# Altium footprint library Radio Lib.PcbLib: 41 footprints (part 3 of 3)
Each footprint in its own frame and in the unit in brackets; x right, y up, seen from the top. Pads: shape width x height; smd on the part's side, far side on the other; paste and mask are expansions set on the pad; w line width, h text height; cw(c..) or ccw(c..) is an arc to the next point about the centre after c.
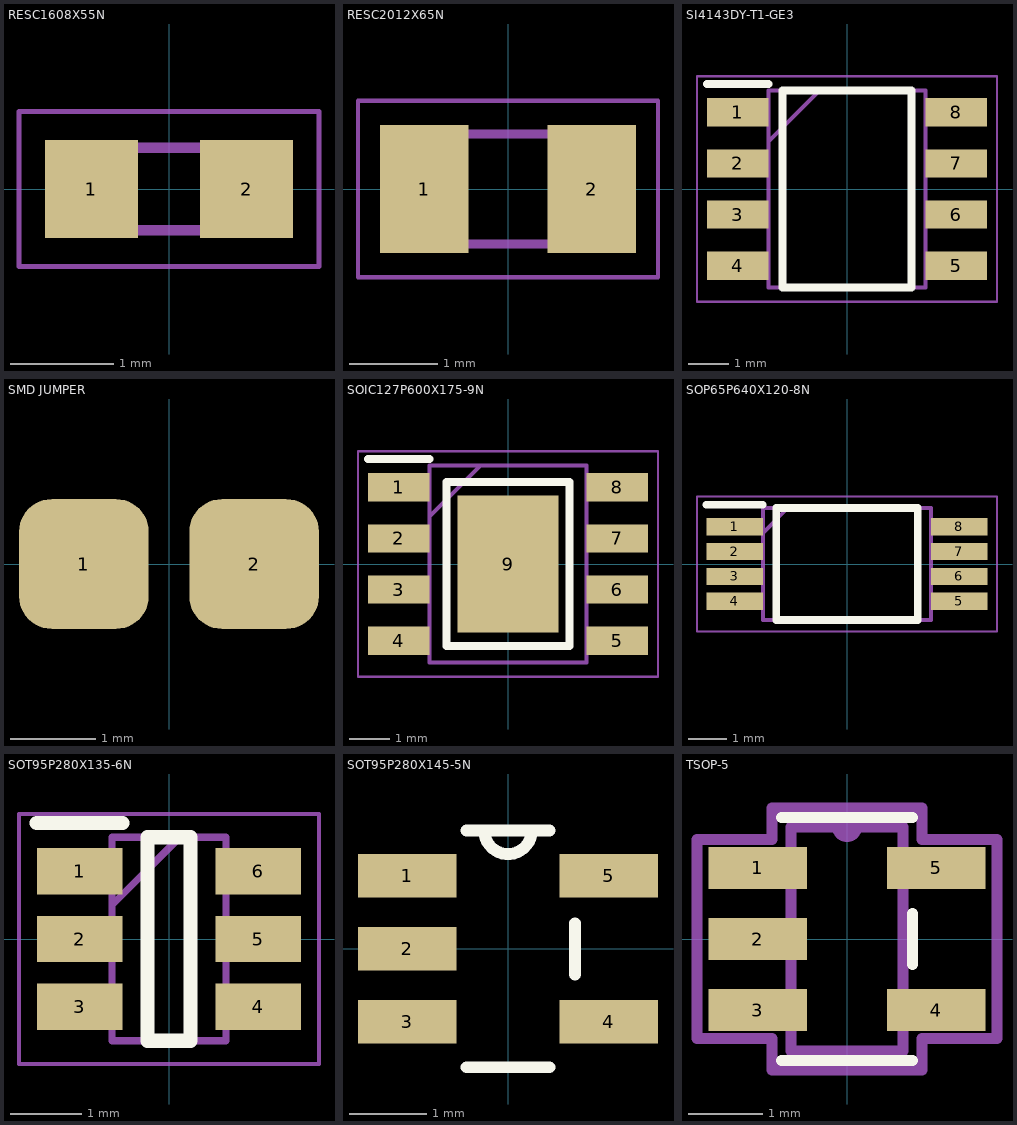
[diagram p2: the footprints below, top view; thin cyan lines are the x and y axes]

## RESC1608X55N [mm]
pads (2):
  rect 0.9x0.95 smd: 1(-0.75,0) 2(0.75,0)
Mechanical 13:
  lines w0.1: -0.775,-0.4 0.775,-0.4 0.775,0.4 -0.775,0.4 -0.775,-0.4
Mechanical 15:
  lines w0.05: -1.45,-0.75 1.45,-0.75 1.45,0.75 -1.45,0.75 -1.45,-0.75
3D body "CPF0603B100KE.stp": height 0.55, standoff 0, extent -0.775,-0.4 0.775,0.4

## RESC2012X65N [mm]
pads (2):
  rect 1x1.45 smd: 1(-0.95,0) 2(0.95,0)
Mechanical 13:
  lines w0.1: -1,-0.625 -1,0.625 1,0.625 1,-0.625 -1,-0.625
Mechanical 15:
  lines w0.05: -1.7,-1 -1.7,1 1.7,1 1.7,-1 -1.7,-1
3D body "CPF0805B100KE.stp": height 0.65, standoff 0, extent -1,-0.625 1,0.625

## SI4143DY-T1-GE3 [mm]
pads (8):
  rect 1.525x0.7 smd: 1(-2.712,1.905) 2(-2.712,0.635) 3(-2.712,-0.635) 4(-2.712,-1.905) 5(2.712,-1.905) 6(2.712,-0.635) 7(2.712,0.635) 8(2.712,1.905)
Top Overlay:
  lines w0.2: -3.475,2.605 -1.95,2.605 ; -1.6,-2.45 -1.6,2.45 1.6,2.45 1.6,-2.45 -1.6,-2.45
Mechanical 13:
  lines w0.1: -1.95,1.18 -0.68,2.45 ; -1.95,-2.45 -1.95,2.45 1.95,2.45 1.95,-2.45 -1.95,-2.45
Mechanical 15:
  lines w0.05: -3.725,-2.8 -3.725,2.8 3.725,2.8 3.725,-2.8 -3.725,-2.8
3D body "L9110S.stp": height 1.75, standoff 0, extent -3,-2.45 3,2.45

## SMD JUMPER [mil]
pads (2):
  rrect50% 60x60 smd: 1(-39.37,0) 2(39.37,0)

## SOIC127P600X175-9N [mm]
pads (9):
  rect 1.525x0.7 smd: 1(-2.712,1.905) 2(-2.712,0.635) 3(-2.712,-0.635) 4(-2.712,-1.905) 5(2.712,-1.905) 6(2.712,-0.635) 7(2.712,0.635) 8(2.712,1.905)
  rect 2.513x3.402 smd: 9(0,0)
Top Overlay:
  lines w0.2: -3.475,2.605 -1.95,2.605 ; -1.524,-2.032 -1.524,2.032 1.524,2.032 1.524,-2.032 -1.524,-2.032
Mechanical 13:
  lines w0.1: -1.95,1.18 -0.68,2.45 ; -1.95,-2.45 -1.95,2.45 1.95,2.45 1.95,-2.45 -1.95,-2.45
Mechanical 15:
  lines w0.05: -3.725,-2.8 -3.725,2.8 3.725,2.8 3.725,-2.8 -3.725,-2.8
3D body "TP4056.stp": height 1.75, standoff 0, extent -3,-2.45 3,2.45

## SOP65P640X120-8N [mm]
pads (8):
  rect 1.475x0.45 smd: 1(-2.938,0.975) 2(-2.938,0.325) 3(-2.938,-0.325) 4(-2.938,-0.975) 5(2.938,-0.975) 6(2.938,-0.325) 7(2.938,0.325) 8(2.938,0.975)
Top Overlay:
  lines w0.2: -3.675,1.55 -2.2,1.55 ; -1.85,-1.465 1.85,-1.465 1.85,1.465 -1.85,1.465 -1.85,-1.465
Mechanical 13:
  lines w0.1: -2.2,0.815 -1.55,1.465 ; -2.2,-1.465 2.2,-1.465 2.2,1.465 -2.2,1.465 -2.2,-1.465
Mechanical 15:
  lines w0.05: -3.925,-1.765 3.925,-1.765 3.925,1.765 -3.925,1.765 -3.925,-1.765
3D body "FS8205A.stp": height 1.2, standoff 0, extent -3.2,-1.465 3.2,1.465

## SOT95P280X135-6N [mm]
pads (6):
  rect 1.2x0.65 smd: 1(-1.25,0.95) 2(-1.25,0) 3(-1.25,-0.95) 4(1.25,-0.95) 5(1.25,0) 6(1.25,0.95)
Top Overlay:
  lines w0.2: -1.85,1.625 -0.65,1.625 ; -0.3,-1.425 -0.3,1.425 0.3,1.425 0.3,-1.425 -0.3,-1.425
Mechanical 13:
  lines w0.1: -0.8,0.475 0.15,1.425 ; -0.8,-1.425 -0.8,1.425 0.8,1.425 0.8,-1.425 -0.8,-1.425
Mechanical 15:
  lines w0.05: -2.1,-1.75 -2.1,1.75 2.1,1.75 2.1,-1.75 -2.1,-1.75
3D body "DW01-P.stp": height 1.35, standoff 0, extent -1.4,-1.425 1.4,1.425

## SOT95P280X145-5N [mil]
pads (5):
  rect 50x22 smd: 1(-51,37) 2(-51,0) 3(-51,-37) 4(51,-37) 5(51,37)
Top Overlay:
  lines w6: -21,-60 21,-60 ; -21,60 -12,60 ; 21,60 12,60 ; 34,-13 34,13 ; -12,60 ccw(c0,60) 12,60 ; -12,60 12,60
3D body "TPS73225DBVR--3DModel-STEP-56544.STEP": height 56.73, standoff -0.35, extent -55.11,-57.08 55.12,57.09
3D body: height 153.35, standoff -41.54, extent -105,-75 -105,-75

## TSOP-5 [mil]
pads (5):
  rect 52x22 smd: 1(-47,37.4) 2(-47,0) 3(-47,-37.4) 4(47,-37.4) 5(47,37.4)
Top Overlay:
  lines w6: -34.5,-64 34.5,-64 ; -34.5,64 34.5,64 ; 34.5,-13.3 34.5,13.3
Mechanical 1:
  lines w1: -59,-47.4 -59,-27.4 -29.5,-27.4 -29.5,-47.4 -59,-47.4 ; -59,-10 -59,10 -29.5,10 -29.5,-10 -59,-10 ; -59,27.4 -59,47.4 -29.5,47.4 -29.5,27.4 -59,27.4 ; -29.5,-59 29.5,-59 29.5,59 -29.5,59 -29.5,-59 ; 29.5,-47.4 29.5,-27.4 59,-27.4 59,-47.4 29.5,-47.4 ; 29.5,27.4 29.5,47.4 59,47.4 59,27.4 29.5,27.4
Mechanical 16:
  lines w6: -4.92,59 ccw(c0,59) 4.92,59 ; -79,-52.4 -39.5,-52.4 -39.5,-69 39.5,-69 39.5,-52.4 79,-52.4 79,52.4 39.5,52.4 39.5,69 -39.5,69 -39.5,52.4 -79,52.4 -79,-52.4 ; -29.5,-59 -29.5,59 29.5,59 29.5,-59 -29.5,-59
3D body "TSOP-5.step": height 43.11, standoff 0, extent -59.01,-59.01 59.01,59.02